# Altium footprint library ParsaLibrary.PcbLib: 526 footprints (part 24 of 33)
Each footprint in its own frame and in the unit in brackets; x right, y up, seen from the top. Pads: shape width x height; smd on the part's side, far side on the other; paste and mask are expansions set on the pad; w line width, h text height; cw(c..) or ccw(c..) is an arc to the next point about the centre after c.
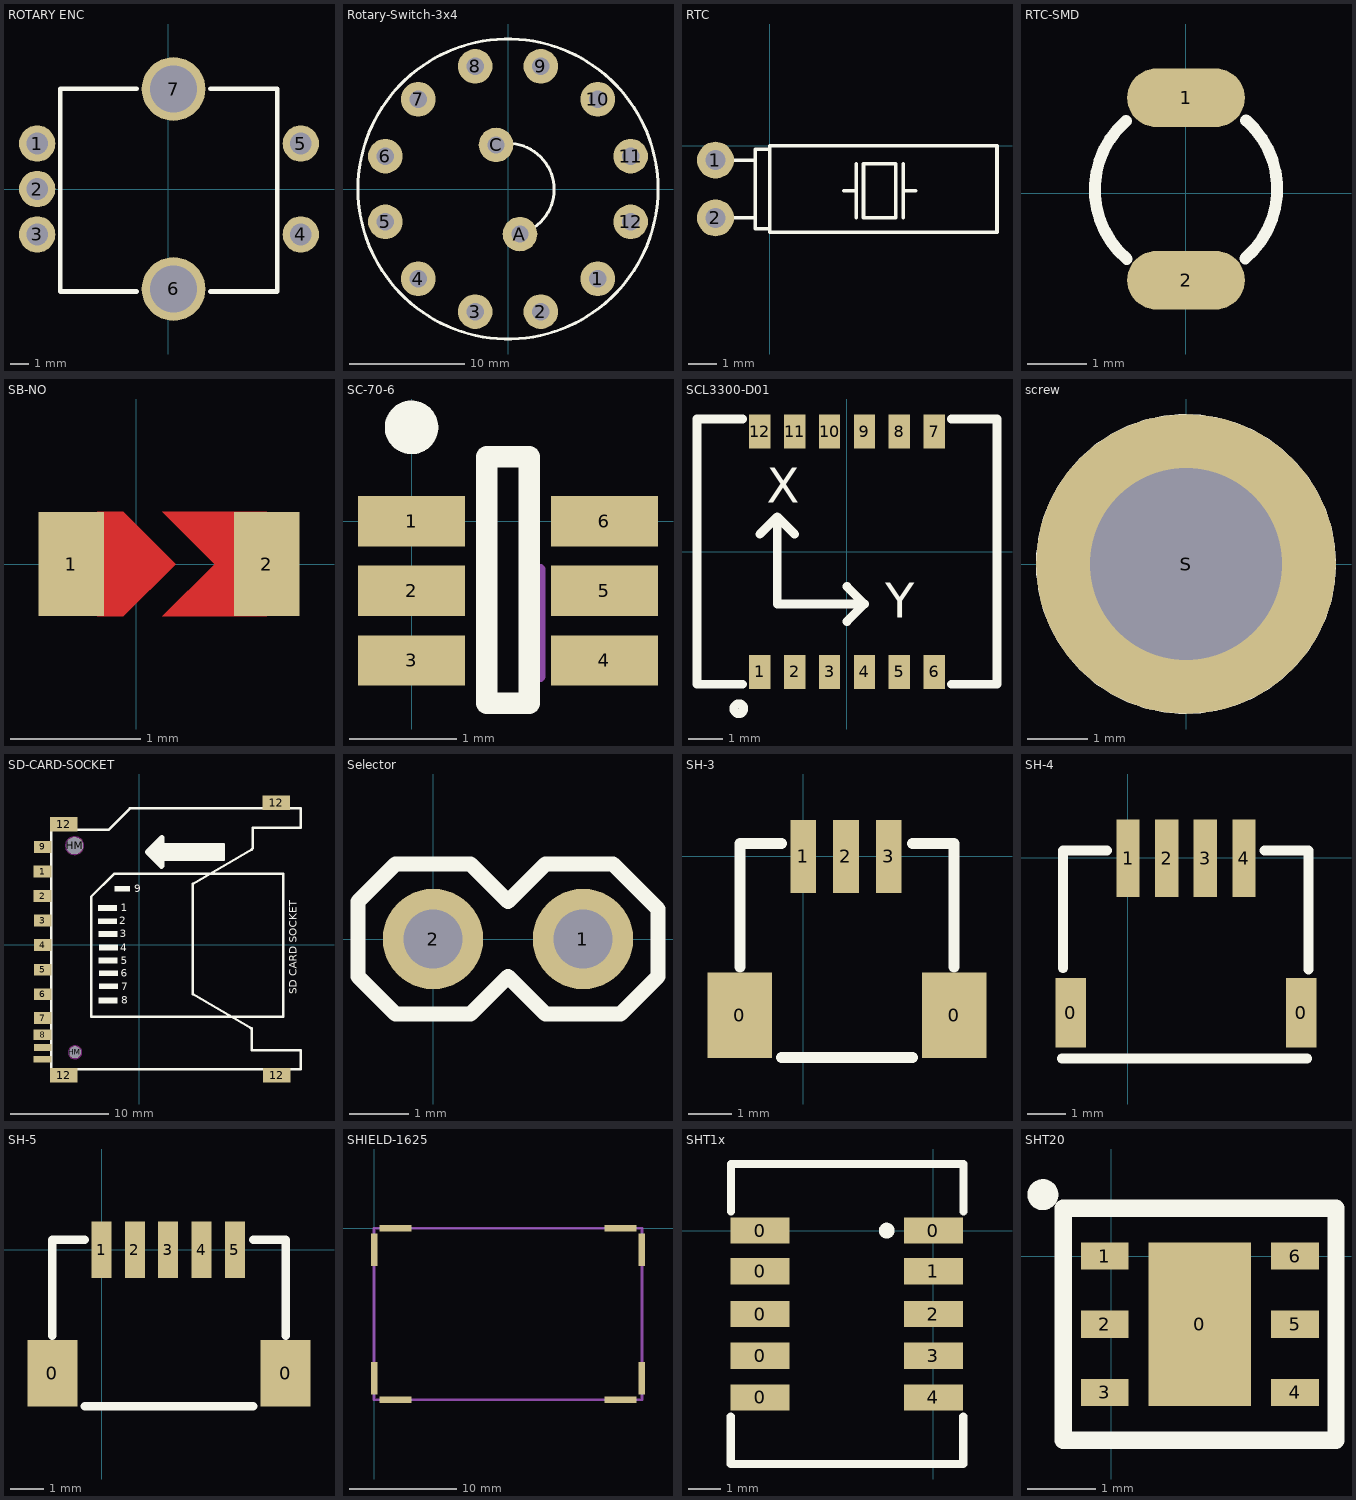
[diagram p23: the footprints below, top view; thin cyan lines are the x and y axes]

## ROTARY ENC [mm] "ROTARY ENCODER"
pads (7):
  round 2 hole 1.2: 1(-7.2,2.516) 2(-7.2,0.016) 3(-7.2,-2.484) 4(7.3,-2.484) 5(7.3,2.516)
  round 3.5 hole 2.6: 6(0.3,-5.484) 7(0.3,5.516)
Top Overlay:
  lines w0.254: -1.739,-5.623 -5.93,-5.623 -5.93,5.528 -1.714,5.528 ; 2.325,-5.623 6,-5.623 6,5.528 2.325,5.528
3D body "12mm Incremental Encoder - BOURNS PEC11S.stp": height 31.5, standoff -6, extent -8.599,-8.571 8.596,8.619

## Rotary-Switch-3x4 [mm]
pads (14):
  round 3 hole 1.5: 1(7.778,-7.778) 2(2.847,-10.625) 3(-2.847,-10.625) 4(-7.778,-7.778) 5(-10.625,-2.847) 6(-10.625,2.847) 7(-7.778,7.778) 8(-2.847,10.625) 9(2.847,10.625) 10(7.778,7.778) 11(10.625,2.847) 12(10.625,-2.847) A(1.035,-3.907) C(-1.035,3.82)
Top Overlay:
  circle w0.254: c0,0 r13
  lines w0.254: -1.035,3.82 cw(c0,-0.044) 1.035,-3.907
3D body "rotary_asm.stp": height 34.8, standoff -2.5, extent -13,-13 13,13

## RTC [mm]
pads (2):
  round 1.3 hole 0.7: 1(-1.905,-0.508) 2(-1.905,-2.54)
Top Overlay:
  lines w0.127: -1.905,-2.54 -0.508,-2.54 ; -1.905,-0.508 -0.508,-0.508 ; 0,-3.048 8,-3.048 ; 0,-3 0,0 8,0 ; 0,-2.921 -0.508,-2.921 -0.508,-0.127 0,-0.127 ; 2.603,-1.587 3.048,-1.587 ; 3.048,-2.54 3.048,-0.635 ; 4.699,-2.54 4.699,-0.635 ; 4.699,-1.587 5.143,-1.587 ; 8.001,-3 8.001,0 ; 3.302,-2.54 3.302,-0.635 4.445,-0.635 4.445,-2.54 3.302,-2.54

## RTC-SMD [mm]
pads (2):
  oval 2x1 smd: 1(0,1.626) 2(0,-1.474)
Top Overlay:
  lines w0.2: -1.022,1.231 ccw(c0,0.066) -1.006,-1.113 ; 1.006,-1.103 ccw(c0,0.076) 1.022,1.241
3D body "Crystal TH.STEP": height 3.2, standoff 0, extent -1.713,-1.598 9.062,1.852

## SB-NO [mm]
pads (2):
  rect 0.5x0.8 smd mask+0.1: 1(-0.5,0) 2(1,0)
Top Layer:
  region: 0.2,0.4 1,0.4 1,-0.4 0.2,-0.4 0.6,0
  region: 0.3,0 -0.1,0.4 -0.3,0.4 -0.3,-0.4 -0.1,-0.4

## SC-70-6 [mm]
pads (6):
  rect 1x0.47 smd: 1(0,0) 2(0,-0.65) 3(0,-1.3) 4(1.8,-1.3) 5(1.8,-0.65) 6(1.8,0)
Top Overlay:
  circle w0.25: c0,0.875 r0.125
  lines w0.2: 0.7,-1.7 1.1,-1.7 1.1,0.6 0.7,0.6 0.7,-1.7
Mechanical 15:
  lines w0.1: 1.2,-1.45 1.2,-0.45
3D body "User Library-SC70-6.step": height 0.92, standoff -0.03, extent -0.15,-1.65 1.95,0.35

## SCL3300-D01 [mm]
pads (12):
  rect 0.61x0.98 smd: 1(-2.5,-3.445) 2(-1.5,-3.445) 3(-0.5,-3.445) 4(0.5,-3.445) 5(1.5,-3.445) 6(2.5,-3.445) 7(2.5,3.445) 8(1.5,3.445) 9(0.5,3.445) 10(-0.5,3.445) 11(-1.5,3.445) 12(-2.5,3.445)
Top Overlay:
  circle w0.254: c-3.1,-4.5 r0.141
  lines w0.254: -3,-3.8 -4.3,-3.8 -4.3,3.8 -3,3.8 ; -1.5,0.5 -2,1 ; 0,-2 0.5,-1.5 ; 3,-3.8 4.3,-3.8 4.3,3.8 3,3.8 ; -2,1 -2,-1.5 0.5,-1.5 ; -2,1 -2.5,0.5 -2,1 ; 0.5,-1.5 0,-1 0.5,-1.5
  text "Y" at 1.1,-1.9 h1
  text "X" at -2.3,1.4 h1
3D body "User Library-SCL3300 (1).x_b": height 3.3, standoff -0.03, extent -4.3,-3.8 4.3,3.8

## screw [mm]
pads (1):
  round 5 hole 3.2 mask+0.1: S(0,0)
Top Overlay:
  circle w1: c0,0 r2

## SD-CARD-SOCKET [mm]
pads (17):
  rect 1.8x1.2 smd: 1(-9.864,7.428) 2(-9.864,4.939) 3(-9.855,2.445) 4(-9.855,-0.055) 5(-9.855,-2.555) 6(-9.855,-5.055) 7(-9.855,-7.48) 9(-9.855,9.945)
  rect 1.8x1.1 smd: 8(-9.864,-9.184)
  rect 1.8x0.7 smd: 10(-9.855,-10.48) 11(-9.864,-11.673)
  rect 2.8x1.5 smd: 12(-7.721,-13.298) 12(-7.721,12.254) 12(13.919,14.438) 12(13.97,-13.298)
  round 1.7 hole 1.7: HM(-6.604,10.07)
  round 1.2 hole 1.2: HM(-6.564,-10.962)
Top Overlay:
  rectangle: 2.287,8.922 8.56,9.872
  rectangle: 1.57,8.599 2.287,10.409
  rectangle: 1.875,8.277 2.287,9.173
  rectangle: 1.051,9.173 1.875,9.782
  rectangle: 1.328,9.477 2.018,9.952
  rectangle: 1.328,8.904 1.911,9.477
  rectangle: 2.287,9.334 8.56,10.212
  rectangle: 2.287,8.617 8.56,9.029
  rectangle: -2.552,5.409 -0.975,5.983
  rectangle: -4.2,3.438 -2.265,4.011
  rectangle: -4.2,2.076 -2.265,2.649
  rectangle: -4.165,0.785 -2.229,1.359
  rectangle: -4.129,-4.519 -2.193,-3.946
  rectangle: -4.129,-3.193 -2.193,-2.62
  rectangle: -4.129,-0.577 -2.193,-0.003
  rectangle: -4.165,-1.903 -2.229,-1.329
  rectangle: -4.183,-5.971 -2.247,-5.397
  lines w0.254: -2.014,7.201 -2.588,7.201 ; 2.287,10.158 2.341,10.212 8.56,10.212 8.56,8.617 2.52,8.617 2.466,8.671 ; 5.436,-5.03 5.436,6.17 11.43,9.67 ; 5.436,-5.018 11.43,-8.53 ; 11.272,-8.479 11.43,-8.637 11.43,-10.679 ; 11.379,9.67 11.537,9.828 11.537,11.87 16.436,11.87 16.436,13.843 16.409,13.87 -0.965,13.87 -0.965,13.859 -3.154,11.67 -8.964,11.67 -8.964,-12.689 -8.95,-12.703 16.436,-12.703 16.436,-10.73 11.436,-10.73 ; -2.588,7.201 -0.473,7.201 14.653,7.201 14.653,-7.351 -2.838,-7.351 -4.917,-7.351 -4.917,4.872 -2.588,7.201 ; 2.287,8.922 8.56,8.922 8.56,9.872 2.287,9.872 2.287,8.922
  lines w0.5: 2.287,8.008 2.287,10.911
  lines w0.508: 2.251,7.972 0.8,9.424 2.287,10.911
  text "SD CARD SOCKET" at 16.015,-5.057 h0.76
  text "1" at -1.907,3.402 h0.76
  text "2" at -2.05,2.076 h0.76
  text "3" at -2.014,0.75 h0.76
  text "4" at -1.978,-0.684 h0.76
  text "5" at -1.907,-2.01 h0.76
  text "6" at -1.907,-3.265 h0.76
  text "7" at -1.871,-4.663 h0.76
  text "8" at -1.871,-6.025 h0.76
  text "9" at -0.507,5.308 h0.76
Keep-Out Layer:
  circle w0.254: c-6.564,-10.962 r0.6
  circle w0.254: c-6.604,10.07 r0.85
Mechanical 1:
  text "Data2" at -0.831,5.338 h0.76
  text "CS" at -0.975,3.402 h0.76
  text "VSS1" at -1.046,0.678 h0.76
  text "VDD" at -1.046,-0.541 h0.76
  text "Data IN" at -0.975,2.04 h0.76
  text "VSS2" at -0.975,-3.337 h0.76
  text "CLK" at -0.903,-1.903 h0.76
  text "Data OUT" at -0.903,-4.627 h0.76
  text "Data1" at -0.831,-6.061 h0.76
3D body "socket_a-sd-09-c-0-7-3.stp": height 3.3, standoff -0.85, extent -9.906,-13.509 16.45,14.525

## Selector [mm]
pads (2):
  round 1.7 hole 1: 1(2.54,0) 2(0,0)
Top Overlay:
  lines w0.254: -1.27,-0.635 -1.27,0.635 -0.635,1.27 0,1.27 0.635,1.27 1.27,0.635 1.905,1.27 3.048,1.27 3.81,0.508 3.81,-0.635 3.175,-1.27 1.905,-1.27 1.27,-0.635 0.635,-1.27 -0.635,-1.27 -1.27,-0.635
3D body "jumper.STEP": height 8.39, standoff -2.53, extent -1.244,-1.295 3.836,1.245
3D body "User Library-Mini Jumper.SLDPRT": height 16.15, standoff 2.65, extent -1.235,-1.194 3.815,1.196

## SH-3 [mm]
pads (5):
  rect 1.5x2 smd: 0(-1.475,-3.704) 0(3.522,-3.704)
  rect 0.6x1.7 smd: 1(0,0) 2(1,0) 3(2,0)
Top Overlay:
  lines w0.254: -1.475,-2.581 -1.475,0.301 -0.506,0.301 ; -0.506,-4.695 2.553,-4.694 ; 2.553,0.301 3.522,0.301 3.522,-2.581
3D body "User Library-sh03w_asm.STEP": height 3.14, standoff 0, extent -1.5,-4.706 3.5,0.254

## SH-4 [mm]
pads (6):
  rect 0.8x1.8 smd: 0(-1.475,-4.012) 0(4.495,-4.012)
  rect 0.6x2 smd: 1(0.01,-0.008) 2(1.01,-0.008) 3(2.01,-0.008) 4(3.01,-0.008)
Top Overlay:
  lines w0.254: -1.71,-5.191 4.651,-5.191 ; -1.676,-2.858 -1.676,0.192 -0.535,0.192 ; 3.543,0.192 4.684,0.192 4.684,-2.887
3D body "User Library-sh04w_asm.STEP": height 3.14, standoff 0, extent -1.49,-4.945 4.51,0.015

## SH-5 [mm]
pads (7):
  rect 1.5x2 smd: 0(-1.475,-3.704) 0(5.522,-3.704)
  rect 0.6x1.7 smd: 1(0,0) 2(1,0) 3(2,0) 4(3,0) 5(4,0)
Top Overlay:
  lines w0.254: -1.475,-2.581 -1.475,0.301 -0.506,0.301 ; -0.506,-4.695 4.553,-4.695 ; 4.553,0.301 5.522,0.301 5.522,-2.581
3D body "User Library-sh05w_asm.STEP": height 3.14, standoff 0, extent -1.5,-4.706 5.5,0.254

## SHIELD-1625 [mm]
pads (8):
  rect 0.6x3 smd: 0(0,-14) 0(0,-2) 0(25,-14) 0(25,-2)
  rect 3x0.6 smd: 0(2,-16) 0(2,0) 0(23,-16) 0(23,0)
Mechanical 1:
  lines w0.254: 0,-16 0,0 25,0 25,-16 0,-16

## SHT1x [mm]
pads (10):
  rect 1.8x0.8 smd: 0(-5.28,-5.08) 0(-5.28,-3.81) 0(-5.28,-2.54) 0(-5.28,-1.24) 0(-5.28,0) 0(0,0) 1(0,-1.24) 2(0,-2.54) 3(0,-3.81) 4(0,-5.08)
Top Overlay:
  circle w0.254: c-1.422,0 r0.114
  lines w0.254: -6.172,-5.664 -6.172,-7.109 0.908,-7.109 0.908,-5.664 ; -6.166,0.584 -6.166,2.029 0.914,2.029 0.914,0.584

## SHT20 [mm]
pads (7):
  rect 1.5x2.4 smd: 0(1.3,-1)
  rect 0.7x0.4 smd: 1(-0.09,0) 2(-0.09,-1) 3(-0.09,-2) 4(2.7,-2) 5(2.7,-1) 6(2.7,0)
Top Overlay:
  circle w0.254: c-1,0.9 r0.1
  lines w0.254: -0.7,-2.7 3.3,-2.7 3.3,0.7 -0.7,0.7 -0.7,-2.7
3D body "User Library-SHT20-1 (1).x_t": height 1.1, standoff -0.01, extent -0.21,-2.5 2.81,0.5